# Altium footprint library alex_footprint.PcbLib: 262 footprints (part 4 of 17)
Each footprint in its own frame and in the unit in brackets; x right, y up, seen from the top. Pads: shape width x height; smd on the part's side, far side on the other; paste and mask are expansions set on the pad; w line width, h text height; cw(c..) or ccw(c..) is an arc to the next point about the centre after c.
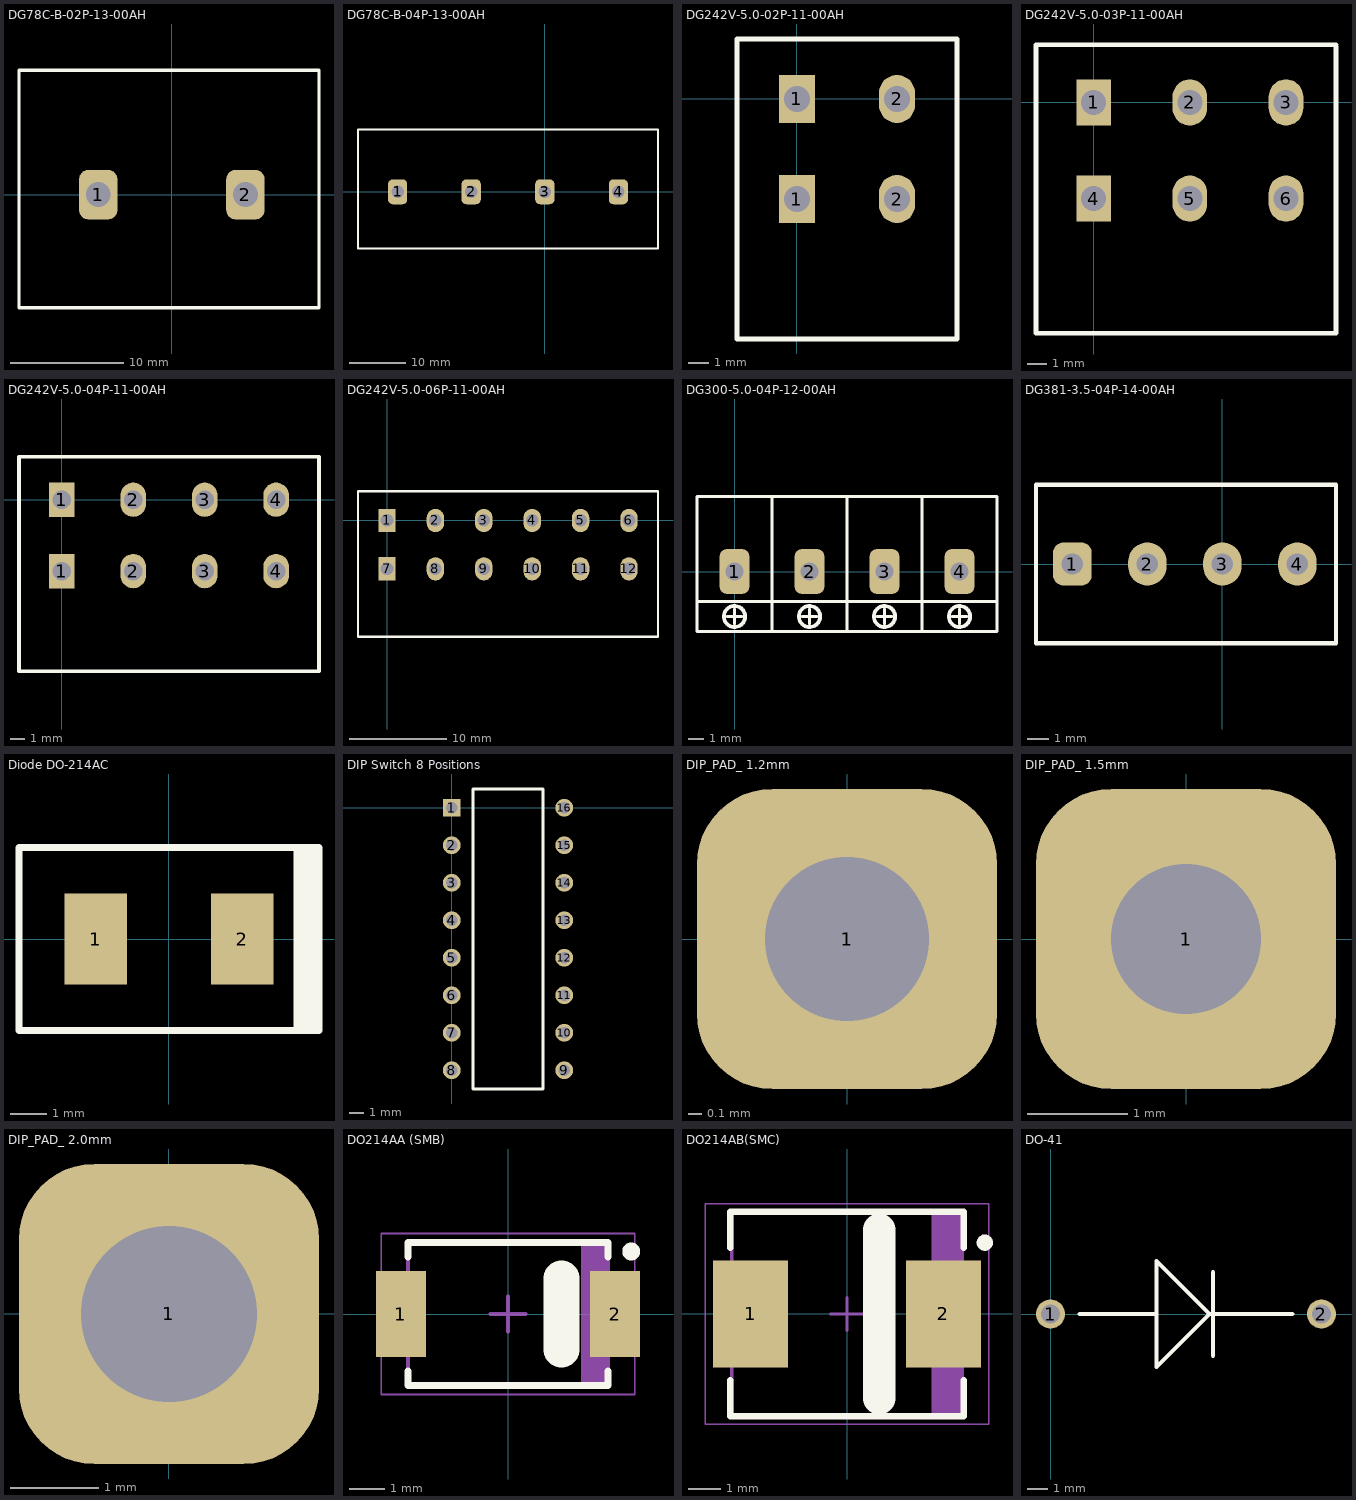
[diagram p3: the footprints below, top view; thin cyan lines are the x and y axes]

## DG78C-B-02P-13-00AH [mm]
pads (2):
  rrect50% 3.4x4.4 hole 2.2 unplated mask+0.25: 1(-6.5,0) 2(6.5,0)
Top Overlay:
  lines w0.3: 8.5,-10 13,-10 13,11 -13.5,11 -13.5,0 -13.5,-10 9.5,-10

## DG78C-B-04P-13-00AH [mm]
pads (4):
  rrect50% 3.4x4.4 hole 2.2 unplated mask+0.25: 1(-26,0) 2(-13,0) 3(0,0) 4(13,0)
Top Overlay:
  lines w0.3: -11,-10 20,-10 20,11 -33,11 -33,0 -33,-10 -10,-10

## DG242V-5.0-02P-11-00AH [mm]
pads (4):
  rect 1.8x2.4 hole 1.3 unplated: 1(0,-5) 1(0,0)
  oval 1.8x2.4 hole 1.3 unplated: 2(5,-5) 2(5,0)
Top Overlay:
  lines w0.254: 8,-12 -3,-12 -3,3 8,3 ; 8,-11.9 8,-7.4 8,-0.4 8,2.9

## DG242V-5.0-03P-11-00AH [mm]
pads (6):
  rect 1.8x2.4 hole 1.3 unplated: 1(0,0) 4(0,-5)
  oval 1.8x2.4 hole 1.3 unplated: 2(5,0) 3(10,0) 5(5,-5) 6(10,-5)
Top Overlay:
  lines w0.254: 12.6,2.9 12.6,-0.6 12.6,-7.6 12.6,-12 -3,-12 -3,3 12.6,3

## DG242V-5.0-04P-11-00AH [mm]
pads (8):
  rect 1.8x2.4 hole 1.3 unplated: 1(0,-5) 1(0,0)
  oval 1.8x2.4 hole 1.3 unplated: 2(5,-5) 2(5,0) 3(10,-5) 3(10,0) 4(15,-5) 4(15,0)
Top Overlay:
  lines w0.254: -3,-12 -3,3 18,3 18,-0.5 18,-7.5 18,-12 -3,-12
3D body "DG242V-5.0-04P-1Y-00A(H).stp": height 15.38, standoff -4, extent -4,-15.275 18.8,1.745

## DG242V-5.0-06P-11-00AH [mm]
pads (12):
  rect 1.8x2.4 hole 1.3 unplated: 1(0,0) 7(0,-5)
  oval 1.8x2.4 hole 1.3 unplated: 2(5,0) 3(10,0) 4(15,0) 5(20,0) 6(25,0) 8(5,-5) 9(10,-5) 10(15,-5) 11(20,-5) 12(25,-5)
Top Overlay:
  lines w0.254: -3,-12 28,-12 28,-7.5 28,-0.5 28,3 -3,3 -3,-12

## DG300-5.0-04P-12-00AH [mm]
pads (4):
  rrect50% 2x3 hole 1.2 unplated mask+0.25: 1(0,0) 2(5,0) 3(10,0) 4(15,0)
Top Overlay:
  circle w0.25: c15,-3 r0.707
  circle w0.25: c10,-3 r0.707
  circle w0.25: c5,-3 r0.707
  circle w0.25: c0,-3 r0.707
  lines w0.2: -2.5,-2 17.5,-2 ; -0.5,-3 0.5,-3 ; 0,-3.5 0,-2.5 ; 2.5,-4 2.5,5 ; 4.5,-3 5.5,-3 ; 5,-3.5 5,-2.5 ; 7.5,-4 7.5,5 ; 9.5,-3 10.5,-3 ; 10,-3.5 10,-2.5 ; 12.5,-4 12.5,5 ; 14.5,-3 15.5,-3 ; 15,-3.5 15,-2.5 ; 16.5,-4 17,-4 ; -2.5,-4 -2.5,-4 ; -2.5,-4 -2,-4 0,-4 15,-4 17,-4 ; -2.5,-4 -2.5,5 -2,5 0,5 15,5 17,5 17.5,5 17.5,-4 17,-4

## DG381-3.5-04P-14-00AH [mm]
pads (4):
  rrect50% 1.8x2 hole 1 unplated mask+0.25: 1(-7,0)
  oval 1.8x2 hole 1 unplated mask+0.25: 2(-3.5,0) 3(0,0) 4(3.5,0)
Top Overlay:
  lines w0.2: -8.7,-3.7 -7.4,-3.7 5.3,-3.7 5.3,3.7 -7.4,3.7 -8.7,3.7 -8.7,-3.7

## Diode DO-214AC [mm]
pads (2):
  rect 1.7x2.5 smd: 1(-2,0) 2(2,0)
Top Overlay:
  rectangle: 3.4,-2.5 4.1,2.5
  lines w0.2: -4.1,-2.5 4.1,-2.5 4.1,2.5 -4.1,2.5 -4.1,0 -4.1,-2.5

## DIP Switch 8 Positions [mm]
pads (16):
  rect 1.2x1.2 hole 0.8: 1(0,0)
  round 1.2 hole 0.8: 2(0,-2.54) 3(0,-5.08) 4(0,-7.62) 5(0,-10.16) 6(0,-12.7) 7(0,-15.24) 8(0,-17.78) 9(7.62,-17.78) 10(7.62,-15.24) 11(7.62,-12.7) 12(7.62,-10.16) 13(7.62,-7.62) 14(7.62,-5.08) 15(7.62,-2.54) 16(7.62,0)
Top Overlay:
  lines w0.2: 2.935,1.27 4.675,1.27 ; 3.175,1.27 1.435,1.27 1.435,-19.05 6.185,-19.05 6.185,1.27 4.445,1.27
Mechanical 7:
  text ".Designator" at 0.8,2.5 h1.5

## DIP_PAD_ 1.2mm [mm]
pads (1):
  rrect50% 2.2x2.2 hole 1.2 unplated mask+0.25: 1(0,0)

## DIP_PAD_ 1.5mm [mm]
pads (1):
  rrect50% 3x3 hole 1.5 unplated mask+0.25: 1(0,0)

## DIP_PAD_ 2.0mm [mm]
pads (1):
  rrect50% 3.4x3.4 hole 2 unplated mask+0.25: 1(0,0)

## DO214AA (SMB) [mm]
height 2.45
pads (2):
  rect 1.4x2.4 smd: 1(-3,0) 2(3,0)
Top Overlay:
  circle w0.25: c3.45,1.75 r0.125
  lines w0.2: -2.8,-1.6 -2.8,-2 2.8,-2 2.8,-1.6 ; -2.8,1.6 -2.8,2 2.8,2 2.8,1.6
  lines w1: 1.5,-1 1.5,1
Mechanical 13:
  rectangle: 2.047,-2 2.8,2
  lines w0.1: -2.8,-2 -2.8,2 2.8,2 2.8,-2 -2.8,-2
Mechanical 15:
  lines w0.05: -3.55,-2.25 -3.55,2.25 3.55,2.25 3.55,-2.25 -3.55,-2.25
  lines w0.1: -0.5,0 0.5,0 ; 0,-0.5 0,0.5
3D body: height 2.45, standoff 0, extent -2.8,-2 2.8,2

## DO214AB(SMC) [mm]
height 2.61
pads (2):
  rect 2.3x3.3 smd: 1(-2.975,0) 2(2.975,0)
Top Overlay:
  circle w0.25: c4.25,2.2 r0.125
  lines w0.2: -3.6,-2.05 -3.6,-3.15 3.6,-3.15 3.6,-2.05 ; -3.6,2.05 -3.6,3.15 3.6,3.15 3.6,2.05
  lines w1: 1,-2.6 1,2.6
Mechanical 13:
  rectangle: 2.599,-3.11 3.555,3.11
  lines w0.1: -3.555,-3.11 -3.555,3.11 3.555,3.11 3.555,-3.11 -3.555,-3.11
Mechanical 15:
  lines w0.05: -4.375,-3.4 -4.375,3.4 4.375,3.4 4.375,-3.4 -4.375,-3.4
  lines w0.1: -0.5,0 0.5,0 ; 0,-0.5 0,0.5
3D body: height 2.61, standoff 0, extent -3.555,-3.11 3.555,3.11

## DO-41 [mm]
pads (2):
  round 1.4 hole 0.9: 1(0,0) 2(13,0)
Top Overlay:
  lines w0.2: 1.4,0 5.08,0 ; 7.792,-2 7.792,2 ; 11.6,0 7.62,0 ; 5.08,0 5.08,-1.205 5.08,-2.54 6.115,-1.505 7.62,0 ; 5.08,0 5.08,2.54 7.62,0